# Altium footprint library Caps.PcbLib: 75 footprints (part 1 of 5)
Each footprint in its own frame and in the unit in brackets; x right, y up, seen from the top. Pads: shape width x height; smd on the part's side, far side on the other; paste and mask are expansions set on the pad; w line width, h text height; cw(c..) or ccw(c..) is an arc to the next point about the centre after c.
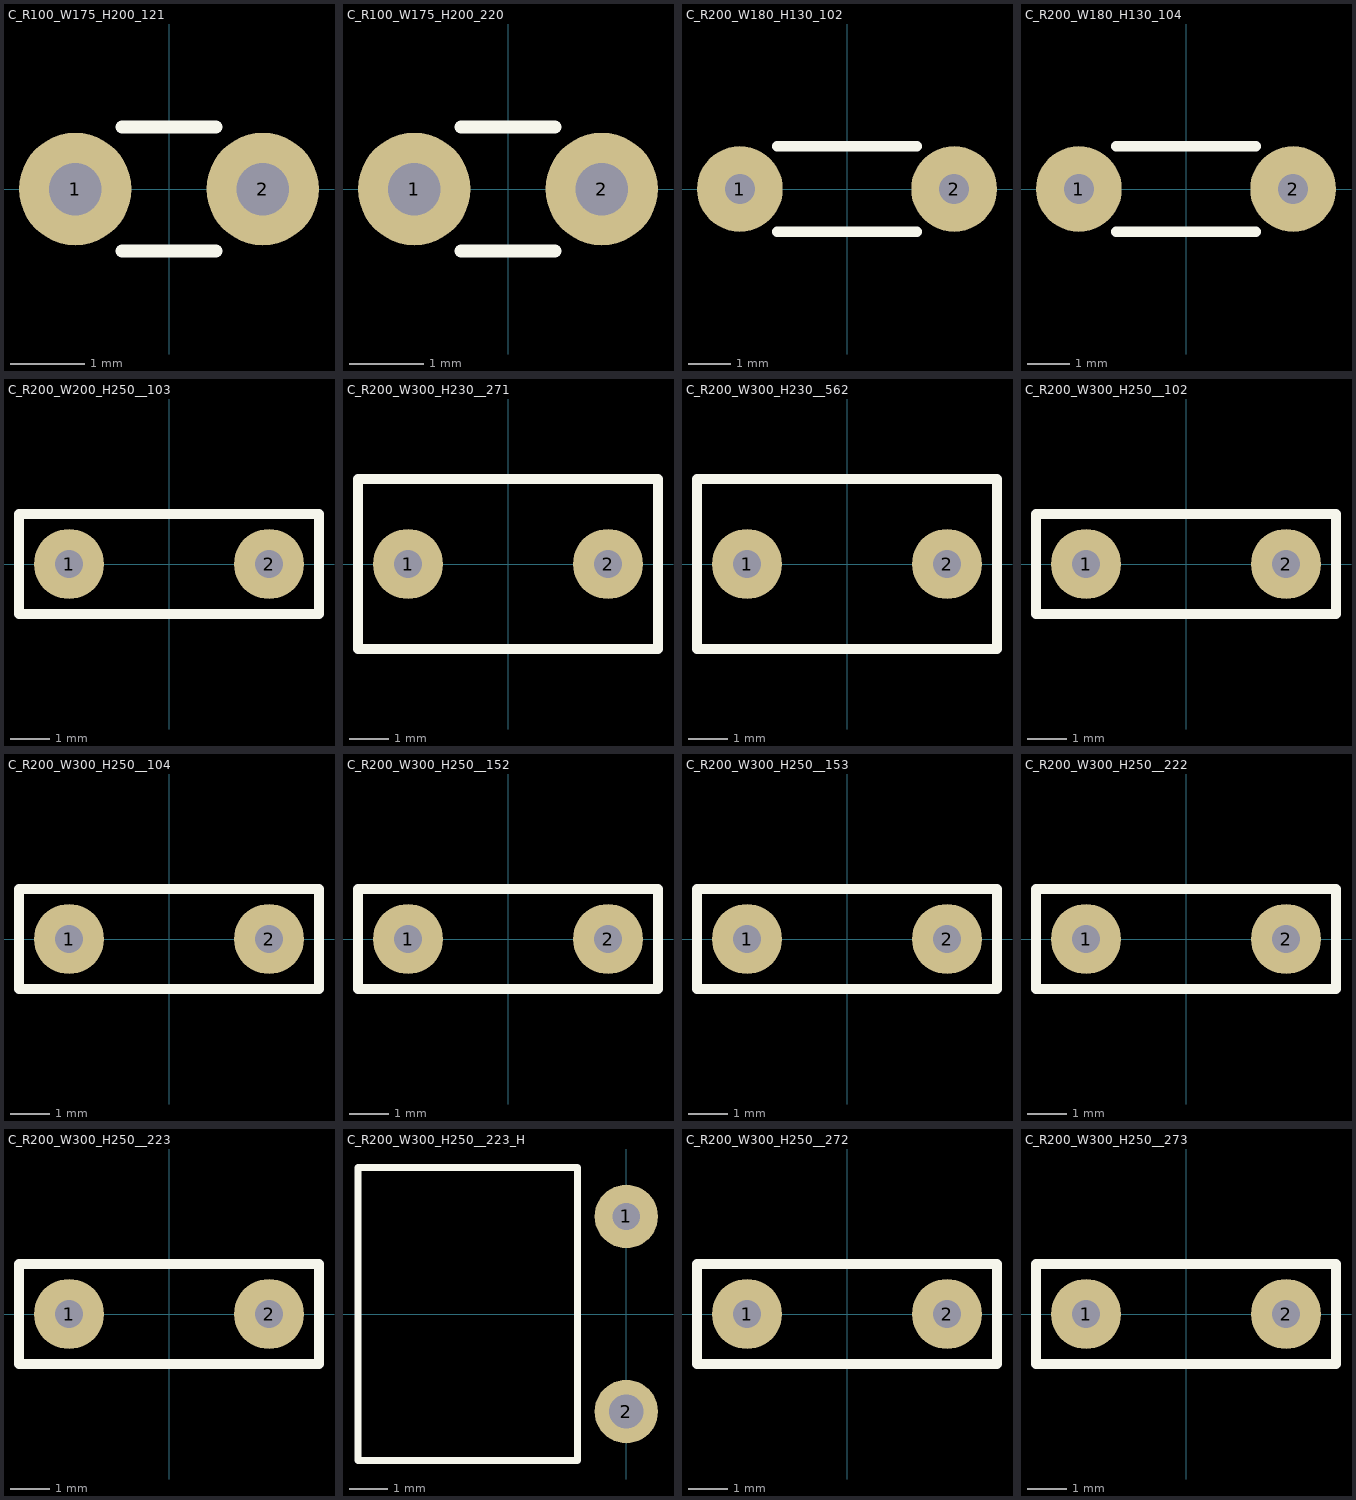
[diagram p0: the footprints below, top view; thin cyan lines are the x and y axes]

## C_R100_W175_H200_121 [mil] "Kond. Ceram Dyskowy"
height 200
pads (2):
  round 60 hole 28: 1(-50,0) 2(50,0)
Top Overlay:
  lines w7: -25,-33 25,-33 ; -25,33 25,33
3D body "C_R100_Ceram_120pF.STEP": height 168.11, standoff -68.11, extent -79,-29.5 78.48,29.56

## C_R100_W175_H200_220 [mil] "Kondes. Ceramiczny dyskowy"
height 200
pads (2):
  round 60 hole 28: 1(-50,0) 2(50,0)
Top Overlay:
  lines w7: -25,-33 25,-33 ; -25,33 25,33
3D body "C_R100_Ceram_22pF.STEP": height 168.11, standoff -68.11, extent -79,-29.5 78.48,29.56

## C_R200_W180_H130_102 [mil] "Capacitor 1.0nF"
height 350
pads (2):
  round 80 hole 28: 1(-100,0) 2(100,0)
Top Overlay:
  lines w10: -65,-40 65,-40 ; -65,40 65,40
3D body "C_R200_W180_H130__1.0n.STEP": height 253.86, standoff -89.23, extent -109.89,-35 109.89,35.87

## C_R200_W180_H130_104 [mil] "Capacitor 100nF"
height 300
pads (2):
  round 80 hole 28: 1(-100,0) 2(100,0)
Top Overlay:
  lines w10: -65,-40 65,-40 ; -65,40 65,40
3D body "C_R200_W180_H130__u10.STEP": height 253.86, standoff -89.23, extent -109.89,-35 109.89,35.87

## C_R200_W200_H250__103 [mil] "Capacitor 10 nF"
height 250
pads (2):
  round 70 hole 28: 1(-100,0) 2(100,0)
Top Overlay:
  lines w10: -150,-50 -150,50 150,50 150,-50 -150,-50
3D body "C_R200_W300_H250__10nF.STEP": height 256.01, standoff -78.64, extent -147.64,-50 147.64,52.36

## C_R200_W300_H230__271 [mil] "Capacitor 270pF"
height 230
pads (2):
  round 70 hole 28: 1(-100,0) 2(100,0)
Top Overlay:
  lines w10: -150,-85 150,-85 150,85 -150,85 -150,-85
3D body "C_R200_W300_H250__270pF.STEP": height 229.35, standoff -77.74, extent -147.64,-86 147.64,87.23

## C_R200_W300_H230__562 [mil] "Capacitor 5.6nF"
height 230
pads (2):
  round 70 hole 28: 1(-100,0) 2(100,0)
Top Overlay:
  lines w10: -150,-85 -150,85 150,85 150,-85 -150,-85
3D body "C_R200_W300_H250__5.6nF_v2.STEP": height 229.35, standoff -77.74, extent -147.64,-86 147.64,87.23

## C_R200_W300_H250__102 [mil] "Capacitor 1.0nF"
height 250
pads (2):
  round 70 hole 28: 1(-100,0) 2(100,0)
Top Overlay:
  lines w10: -150,-50 -150,50 150,50 150,-50 -150,-50
3D body "C_R200_W300_H250__1.0nF.STEP": height 256.01, standoff -78.64, extent -147.64,-50 147.64,52.36

## C_R200_W300_H250__104 [mil] "Capacitor u10"
height 250
pads (2):
  round 70 hole 28: 1(-100,0) 2(100,0)
Top Overlay:
  lines w10: -150,-50 150,-50 150,50 -150,50 -150,-50
3D body "C_R200_W300_H250__u10F.STEP": height 256.91, standoff -77.74, extent -147.64,-50 147.64,52.36

## C_R200_W300_H250__152 [mil] "Capacitor 1.5 nF"
height 250
pads (2):
  round 70 hole 28: 1(-100,0) 2(100,0)
Top Overlay:
  lines w10: -150,-50 -150,50 150,50 150,-50 -150,-50
3D body "C_R200_W300_H250__1.5nF.STEP": height 256.01, standoff -78.64, extent -147.64,-50 147.64,52.36

## C_R200_W300_H250__153 [mil] "Capacitor 15 nF"
height 250
pads (2):
  round 70 hole 28: 1(-100,0) 2(100,0)
Top Overlay:
  lines w10: -150,-50 -150,50 150,50 150,-50 -150,-50
3D body "C_R200_W300_H250__15nF.STEP": height 256.01, standoff -78.64, extent -147.64,-50 147.64,52.36

## C_R200_W300_H250__222 [mil] "Capacitor 2.2 nF"
height 250
pads (2):
  round 70 hole 28: 1(-100,0) 2(100,0)
Top Overlay:
  lines w10: -150,-50 -150,50 150,50 150,-50 -150,-50
3D body "C_R200_W300_H250__2.2nF.STEP": height 256.01, standoff -78.64, extent -147.64,-50 147.64,52.36

## C_R200_W300_H250__223 [mil] "Capacitor 22 nF Vertical"
height 250
pads (2):
  round 70 hole 28: 1(-100,0) 2(100,0)
Top Overlay:
  lines w10: -150,-50 -150,50 150,50 150,-50 -150,-50
3D body "C_R200_W300_H250__22nF.STEP": height 256.01, standoff -78.64, extent -147.64,-50 147.64,52.36

## C_R200_W300_H250__223_H [mil] "Cap 220nF Horizontal"
height 200
pads (2):
  round 65 hole 28: 1(0,100)
  round 65 hole 35: 2(0,-100)
Top Overlay:
  lines w7: -275,-150 -50,-150 -50,150 -275,150 -275,-150
3D body "C_R200_W300_H250__u22F_Horizontal.STEP": height 106.18, standoff -43.43, extent -275.43,-147.64 10,147.64

## C_R200_W300_H250__272 [mil] "Capacitor 2.7 nF"
height 250
pads (2):
  round 70 hole 28: 1(-100,0) 2(100,0)
Top Overlay:
  lines w10: -150,-50 150,-50 150,50 -150,50 -150,-50
3D body "C_R200_W300_H250__2.7nF.STEP": height 256.01, standoff -78.64, extent -147.64,-50 147.64,52.36

## C_R200_W300_H250__273 [mil] "Capacitor 27 nF"
height 250
pads (2):
  round 70 hole 28: 1(-100,0) 2(100,0)
Top Overlay:
  lines w10: -150,-50 -150,50 150,50 150,-50 -150,-50
3D body "C_R200_W300_H250__27nF.STEP": height 256.01, standoff -78.64, extent -147.64,-50 147.64,52.36